# Altium footprint library ICL_komponenty_v1.PcbLib: 160 footprints (part 8 of 10)
Each footprint in its own frame and in the unit in brackets; x right, y up, seen from the top. Pads: shape width x height; smd on the part's side, far side on the other; paste and mask are expansions set on the pad; w line width, h text height; cw(c..) or ccw(c..) is an arc to the next point about the centre after c.
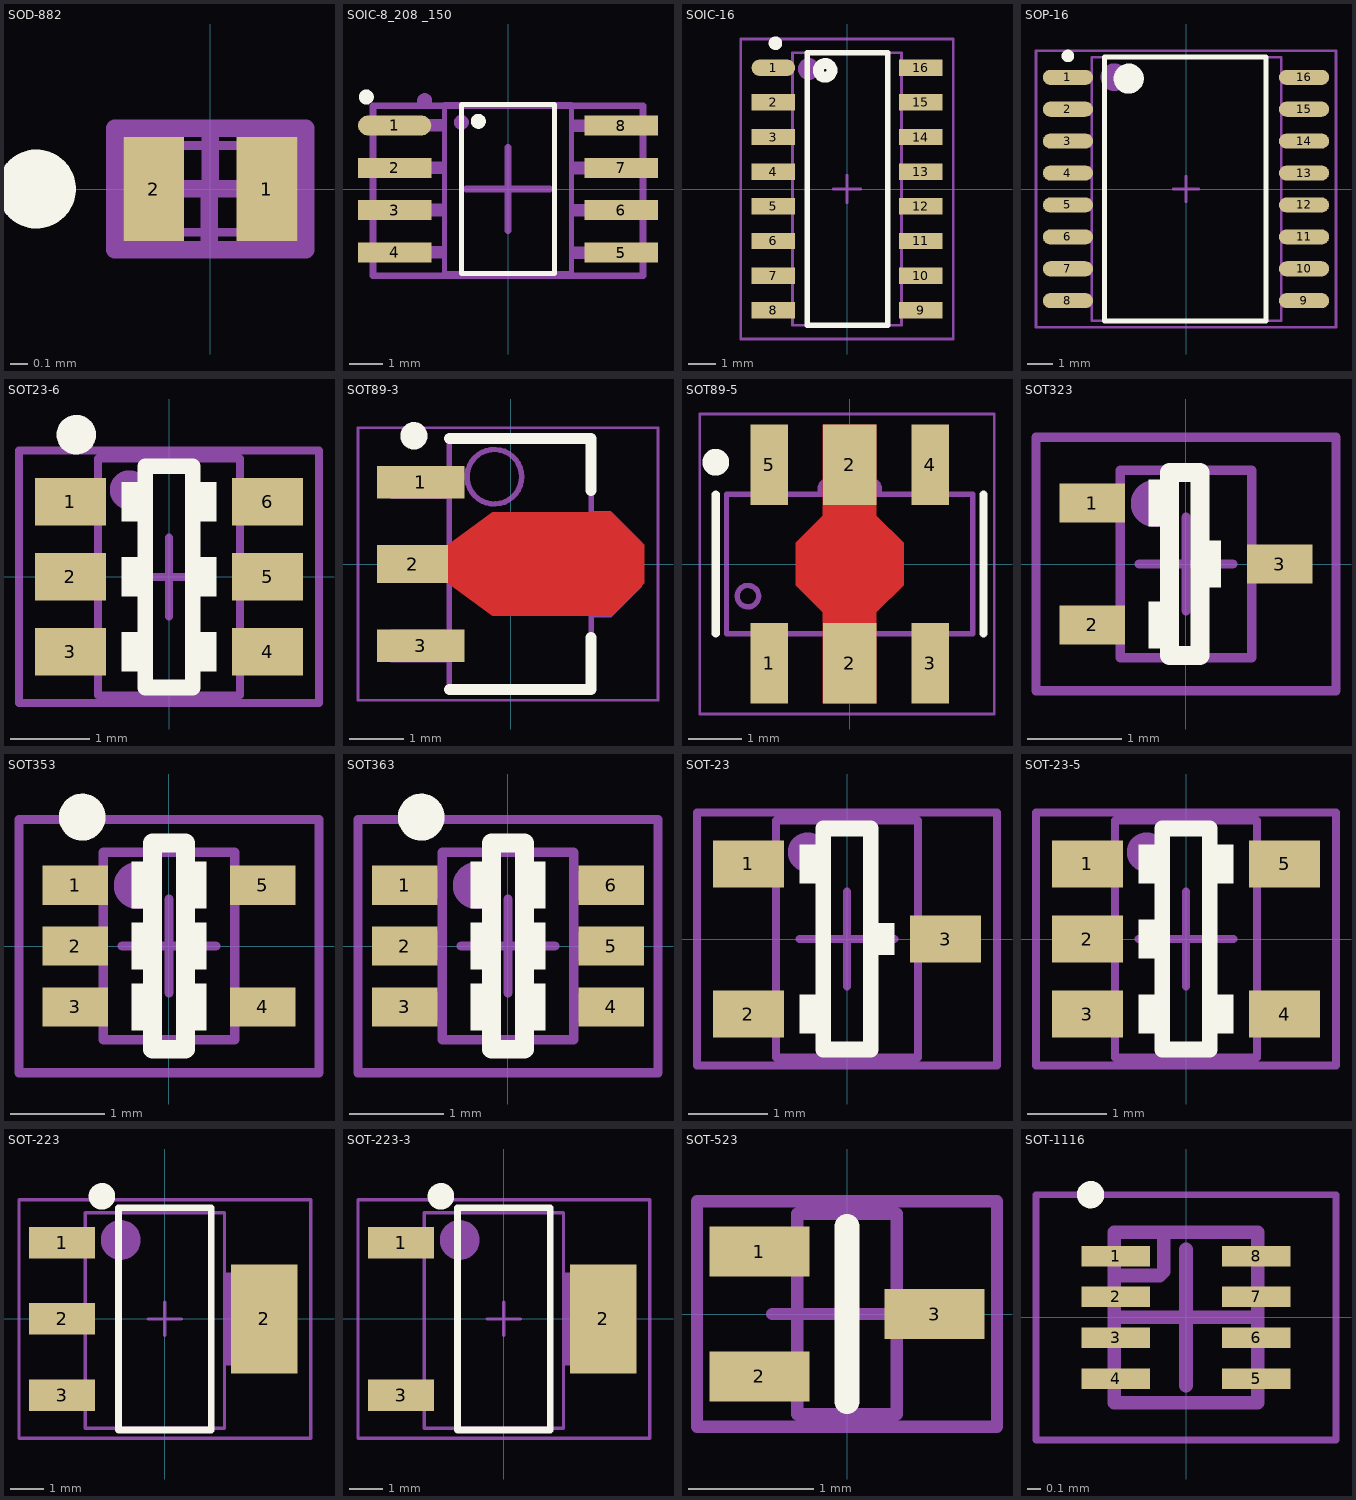
[diagram p7: the footprints below, top view; thin cyan lines are the x and y axes]

## SOD-882 [mm]
pads (2):
  rect 0.35x0.6 smd: 1(0.325,0) 2(-0.325,0)
Top Overlay:
  circle w0.254: c-1,0 r0.1
Top M11-12_SMOT:
  rectangle: -0.474,-0.25 -0.374,0.25
  rectangle: -0.3,-0.25 -0.2,0.25
  rectangle: 0.35,-0.25 0.45,0.25
  lines w0.05: -0.45,-0.249 0.427,-0.249 ; -0.45,0.25 0.425,0.25
Top M13-14_SDES:
  text "'.Designator'" at -2.316,0.633 h0.4
Top M15-16_SORG:
  lines w0.1: -0.304,0.001 -0.004,0.001 ; -0.005,-0.299 -0.005,0.001 0.295,0.001 ; 0,0 0,0.3 ; -0.55,-0.35 0.55,-0.35 0.55,0.35 -0.55,0.35 -0.55,-0.35
3D body: height 2, standoff 0, extent -0.5,-0.299 0.5,0.3

## SOIC-8_208 _150 [mm] "150 - 208mm soic 8 package FLASH"
pads (8):
  oval 2.2x0.6 smd: 1(-3.4,1.905)
  rect 2.2x0.6 smd: 2(-3.4,0.635) 3(-3.4,-0.635) 4(-3.4,-1.905) 5(3.4,-1.905) 6(3.4,-0.635) 7(3.4,0.635) 8(3.4,1.905)
Top Overlay:
  circle w0.25: c-4.252,2.76 r0.1
  circle w0.25: c-0.889,2.032 r0.1
  lines w0.152: -1.397,-2.54 1.397,-2.54 1.397,2.54 -1.397,2.54 -1.397,-2.54
Top M11-12_SMOT:
  circle w0.25: c-1.4,2 r0.1
  circle w0.25: c-2.5,2.65 r0.1
  region: 3.6,2.092 1.9,2.092 1.9,1.71 3.6,1.71
  region: 3.6,-1.718 1.9,-1.718 1.9,-2.1 3.6,-2.1
  rectangle: -3.6,1.718 -1.9,2.1
  rectangle: -3.6,-2.092 -1.9,-1.71
  region: 3.6,0.822 1.9,0.822 1.9,0.44 3.6,0.44
  region: 3.6,-0.448 1.9,-0.448 1.9,-0.83 3.6,-0.83
  rectangle: -3.6,0.448 -1.9,0.83
  rectangle: -3.6,-0.822 -1.9,-0.44
  lines w0.152: -0.64,2.54 0.576,2.54 1.9,2.54 1.9,-2.54 -1.9,-2.54 -1.9,2.54 -0.64,2.54 ; -0.64,2.54 -0.64,2.54
Top M13-14_SDES:
  text "'.Designator'" at -6.798,-0.5 h1.2
Top M15-16_SORG:
  lines w0.2: -1.25,0 0,0 ; 0,-1.25 0,0 ; 0,1.25 0,0 ; 1.25,0 0,0 ; -4.05,-2.6 4.05,-2.6 4.05,2.5 -4.05,2.5 -4.05,-2.6
3D body "SO-8.STEP": height 1.89, standoff -0.01, extent -3.144,-2.515 3.195,2.489

## SOIC-16 [mm] "SOIC, 16-Leads, Body 10,0x4,0mm (max), Pitch 1,27mm, IPC Low Density"
height 1.75
pads (16):
  oval 1.6x0.6 smd: 1(-2.7,4.445)
  rect 1.6x0.6 smd: 2(-2.7,3.175) 3(-2.7,1.905) 4(-2.7,0.635) 5(-2.7,-0.635) 6(-2.7,-1.905) 7(-2.7,-3.175) 8(-2.7,-4.445) 9(2.7,-4.445) 10(2.7,-3.175) 11(2.7,-1.905) 12(2.7,-0.635) 13(2.7,0.635) 14(2.7,1.905) 15(2.7,3.175) 16(2.7,4.445)
Top Overlay:
  circle w0.4: c-0.8,4.35 r0.25
  circle w0.25: c-2.625,5.345 r0.125
  lines w0.2: -1.45,-5 1.5,-5 1.5,5 -1.45,5 -1.45,-5
Top M11-12_SMOT:
  circle w0.4: c-1.4,4.4 r0.2
  rectangle: -2.85,-4.64 -2,-4.24
  rectangle: -2.85,-3.37 -2,-2.97
  rectangle: -2.85,-0.83 -2,-0.43
  rectangle: -2.85,0.44 -2,0.84
  rectangle: -2.85,2.98 -2,3.38
  rectangle: -2.85,4.25 -2,4.65
  region: 2.85,-4.25 2,-4.25 2,-4.65 2.85,-4.65
  region: 2.85,-2.98 2,-2.98 2,-3.38 2.85,-3.38
  region: 2.85,-0.44 2,-0.44 2,-0.84 2.85,-0.84
  region: 2.85,0.83 2,0.83 2,0.43 2.85,0.43
  region: 2.85,3.37 2,3.37 2,2.97 2.85,2.97
  region: 2.85,4.64 2,4.64 2,4.24 2.85,4.24
  rectangle: -2.85,-2.1 -2,-1.7
  rectangle: -2.85,1.71 -2,2.11
  region: 2.85,-1.71 2,-1.71 2,-2.11 2.85,-2.11
  region: 2.85,2.1 2,2.1 2,1.7 2.85,1.7
  lines w0.1: -2,-5 -2,5 2,5 2,-5 -2,-5
Top M13-14_SDES:
  text "'.Designator'" at 0.5,-6.798 h1.2
Top M15-16_SORG:
  lines w0.1: -0.5,0 0.5,0 ; 0,-0.5 0,0.5 ; -3.9,-5.5 3.9,-5.5 3.9,5.5 -3.9,5.5 -3.9,-5.5
3D body "SO-16.step": height 1.45, standoff 0, extent -2.857,-4.991 3.048,4.991

## SOP-16 [mm]
height 2
pads (16):
  oval 2x0.6 smd: 1(-4.7,4.445) 2(-4.7,3.175) 3(-4.7,1.905) 4(-4.7,0.635) 5(-4.7,-0.635) 6(-4.7,-1.905) 7(-4.7,-3.175) 8(-4.7,-4.445) 9(4.7,-4.445) 10(4.7,-3.175) 11(4.7,-1.905) 12(4.7,-0.635) 13(4.7,0.635) 14(4.7,1.905) 15(4.7,3.175) 16(4.7,4.445)
Top Overlay:
  circle w0.25: c-4.7,5.295 r0.125
  circle w0.6: c-2.281,4.394 r0.3
  lines w0.2: -3.251,-5.25 -3.251,5.25 3.175,5.25 3.175,-5.25 -3.251,-5.25
Top M11-12_SMOT:
  circle w0.6: c-2.85,4.45 r0.25
  rectangle: -5,-4.69 -3.75,-4.19
  rectangle: -5,-3.42 -3.75,-2.92
  rectangle: -5,-0.88 -3.75,-0.38
  rectangle: -5,0.39 -3.75,0.89
  rectangle: -5,2.93 -3.75,3.43
  rectangle: -5,4.2 -3.75,4.7
  region: 5,-4.2 3.75,-4.2 3.75,-4.7 5,-4.7
  region: 5,-2.93 3.75,-2.93 3.75,-3.43 5,-3.43
  region: 5,-0.39 3.75,-0.39 3.75,-0.89 5,-0.89
  region: 5,0.88 3.75,0.88 3.75,0.38 5,0.38
  region: 5,3.42 3.75,3.42 3.75,2.92 5,2.92
  region: 5,4.69 3.75,4.69 3.75,4.19 5,4.19
  rectangle: -5,-2.15 -3.75,-1.65
  rectangle: -5,1.66 -3.75,2.16
  region: 5,-1.66 3.75,-1.66 3.75,-2.16 5,-2.16
  region: 5,2.15 3.75,2.15 3.75,1.65 5,1.65
  lines w0.1: -3.75,-5.25 -3.75,5.25 3.8,5.25 3.8,-5.25 -3.75,-5.25
Top M13-14_SDES:
  text "'.Designator'" at 0.5,-6.798 h1.2
Top M15-16_SORG:
  lines w0.1: -0.5,0 0.5,0 ; 0,-0.5 0,0.5 ; -5.969,-5.5 -5.969,5.5 5.969,5.5 5.969,-5.5 -5.969,-5.5
3D body "so16w.step": height 3.5, standoff 0, extent -5.15,-5.171 5.15,5.029

## SOT23-6 [mm] "Zetex"
height 1.45
pads (6):
  rect 0.9x0.6 smd: 1(-1.25,0.95) 2(-1.25,0) 3(-1.25,-0.95) 4(1.25,-0.95) 5(1.25,0) 6(1.25,0.95)
Top Overlay:
  circle w0.25: c-1.175,1.8 r0.125
  region: 0.6,1.2 0.2,1.2 0.2,0.7 0.6,0.7
  region: 0.6,0.25 0.2,0.25 0.2,-0.25 0.6,-0.25
  region: 0.6,-0.7 0.2,-0.7 0.2,-1.2 0.6,-1.2
  rectangle: -0.6,-1.2 -0.2,-0.7
  rectangle: -0.6,-0.25 -0.2,0.25
  rectangle: -0.6,0.7 -0.2,1.2
  lines w0.2: -0.3,-1.4 0.3,-1.4 0.3,1.4 -0.3,1.4 -0.3,-1.4
Top M11-12_SMOT:
  circle w0.3: c-0.5,1.1 r0.1
  rectangle: -1.5,-1.2 -0.9,-0.7
  rectangle: -1.5,0.7 -0.9,1.2
  region: 1.5,-0.7 0.9,-0.7 0.9,-1.2 1.5,-1.2
  region: 1.5,1.2 0.9,1.2 0.9,0.7 1.5,0.7
  rectangle: -1.5,-0.25 -0.9,0.25
  region: 1.5,0.25 0.9,0.25 0.9,-0.25 1.5,-0.25
  lines w0.1: -0.9,-1.5 -0.9,1.5 0.9,1.5 0.9,-1.5 -0.9,-1.5
Top M13-14_SDES:
  text "'.Designator'" at 0.292,-4.265 h0.7
Top M15-16_SORG:
  lines w0.1: -0.5,0 0.5,0 ; 0,-0.5 0,0.5 ; -1.9,-1.6 -1.9,1.6 1.9,1.6 1.9,-1.6 -1.9,-1.6
3D body "SOT23-6.STEP": height 1.3, standoff 0, extent -1.448,-1.499 1.552,1.501

## SOT89-3 [mm] "SOT89-3"
height 1.6
pads (3):
  rect 1.6x0.6 smd: 1(-1.65,1.5) 3(-1.65,-1.5)
  rect 1.3x0.7 smd: 2(-1.8,0)
Top Layer:
  region: -1.2,0.313 -0.335,0.95 1.85,0.95 2.45,0.35 2.45,-0.35 1.85,-0.95 -0.335,-0.95 -1.2,-0.313
Top Overlay:
  circle w0.25: c-1.775,2.35 r0.125
  lines w0.2: -1.125,-2.3 1.475,-2.3 1.475,-1.35 ; -1.125,2.3 1.475,2.3 1.475,1.35
Top M11-12_SMOT:
  circle w0.1: c-0.3,1.6 r0.5
  rectangle: -2.2,1.194 -1.125,1.8
  rectangle: -2.2,-0.319 -1.125,0.3
  rectangle: -2.2,-1.806 -1.125,-1.2
  region: 1.475,0.969 1.831,0.969 2.4,0.4 2.4,-0.42 1.841,-0.979 1.492,-0.979 1.475,-0.962
  lines w0.1: -1.125,-2.3 -1.125,2.3 1.475,2.3 1.475,-2.3 -1.125,-2.3
Top M13-14_SDES:
  text "'.Designator'" at 0.417,-5.965 h1
Top M15-16_SORG:
  lines w0.05: -2.8,-2.5 -2.8,2.5 2.7,2.5 2.7,-2.5 -2.8,-2.5
  lines w0.1: -0.325,0 0.675,0 ; 0.175,-0.5 0.175,0.5
3D body "SOT89-3.step": height 1.6, standoff 0, extent -2.2,-2.297 2,2.296

## SOT89-5 [mm] "SOT89-5"
height 1.6
pads (6):
  rect 0.7x1.5 smd: 1(-1.5,-1.85) 3(1.5,-1.85) 4(1.5,1.85) 5(-1.5,1.85)
  rect 1x1.5 smd: 2(0,-1.85) 2(0,1.85)
Top Layer:
  region: -1.008,0.392 -0.5,0.9 -0.5,2.6 0.5,2.6 0.5,0.9 1.008,0.392 1.008,-0.4 0.5,-0.9 0.5,-2.6 -0.5,-2.6 -0.5,-0.9 -1.008,-0.4
Top Overlay:
  circle w0.25: c-2.5,1.9 r0.125
  lines w0.15: -2.5,-1.3 -2.5,1.3 ; 2.5,-1.3 2.5,1.3
Top M11-12_SMOT:
  circle w0.1: c-1.9,-0.6 r0.2
  region: -1.2,-2.3 -1.2,-1.325 -1.806,-1.325 -1.806,-2.3
  region: 1.8,-2.3 1.8,-1.325 1.194,-1.325 1.194,-2.3
  region: 0.3,-2.3 0.3,-1.325 -0.306,-1.325 -0.306,-2.3
  region: 1.2,2.3 1.2,1.325 1.806,1.325 1.806,2.3
  region: -1.8,2.3 -1.8,1.325 -1.194,1.325 -1.194,2.3
  region: -0.6,1.3 -0.6,1.4 -0.6,1.44 -0.57,1.513 -0.513,1.57 -0.44,1.6 -0.4,1.6 -0.38,1.602 -0.344,1.617 -0.317,1.644 -0.302,1.68 -0.3,1.7 -0.3,2.3 0.3,2.3 0.3,1.7 0.302,1.68 0.317,1.644 0.344,1.617 0.38,1.602 0.4,1.6 0.44,1.6 0.513,1.57 0.57,1.513 0.6,1.44 0.6,1.4 0.6,1.3
  lines w0.1: -2.3,-1.3 2.3,-1.3 2.3,1.3 -2.3,1.3 -2.3,-1.3
Top M13-14_SDES:
  text "'.Designator'" at -5.665,-0.417 h1
Top M15-16_SORG:
  lines w0.05: -2.8,-2.8 2.7,-2.8 2.7,2.8 -2.8,2.8 -2.8,-2.8
  lines w0.1: -0.525,0 0.475,0 ; -0.025,-0.5 -0.025,0.5
3D body "SOT-89-5.step": height 1.51, standoff 0.01, extent -2.25,-2.175 2.25,2.175

## SOT323 [mm]
height 1.1
pads (3):
  rect 0.7x0.42 smd: 1(-1,0.65) 2(-1,-0.65) 3(1,0)
Top Overlay:
  rectangle: 0.2,-0.25 0.375,0.25
  rectangle: -0.4,0.4 -0.15,0.9
  rectangle: -0.4,-0.9 -0.15,-0.4
  lines w0.2: -0.175,-0.975 -0.175,0.975 0.15,0.975 0.15,-0.975 -0.175,-0.975
Top M11-12_SMOT:
  circle w0.3: c-0.339,0.645 r0.1
  rectangle: -1.138,-0.8 -0.7,-0.489
  rectangle: -1.138,0.5 -0.7,0.811
  region: 1.138,0.15 0.7,0.15 0.7,-0.161 1.138,-0.161
  lines w0.1: -0.7,-1 -0.7,1 0.7,1 0.7,-1 -0.7,-1
Top M13-14_SDES:
  text "'.Designator'" at 0.25,-3.599 h0.6
Top M15-16_SORG:
  lines w0.1: -0.5,0 0.5,0 ; 0,-0.5 0,0.5 ; -1.6,-1.35 1.6,-1.35 1.6,1.35 -1.6,1.35 -1.6,-1.35
3D body "SOT323_SC70-3_.STEP": height 1.11, standoff 0.01, extent -1.122,-1.1 1.123,1.1

## SOT353 [mm]
height 1.1
pads (5):
  rect 0.7x0.42 smd: 1(-1,0.65) 2(-1,0) 3(-1,-0.65) 4(1,-0.65) 5(1,0.65)
Top Overlay:
  circle w0.25: c-0.925,1.375 r0.125
  rectangle: -0.4,0.4 -0.15,0.9
  rectangle: -0.4,-0.25 -0.15,0.25
  rectangle: -0.4,-0.9 -0.15,-0.4
  region: 0.4,0.9 0.15,0.9 0.15,0.4 0.4,0.4
  region: 0.4,0.25 0.15,0.25 0.15,-0.25 0.4,-0.25
  region: 0.4,-0.4 0.15,-0.4 0.15,-0.9 0.4,-0.9
  lines w0.2: -0.175,-1.1 0.175,-1.1 0.175,1.1 -0.175,1.1 -0.175,-1.1
Top M11-12_SMOT:
  circle w0.3: c-0.339,0.645 r0.1
  rectangle: -1.138,-0.8 -0.7,-0.489
  rectangle: -1.138,0.5 -0.7,0.811
  region: 1.138,-0.5 0.7,-0.5 0.7,-0.811 1.138,-0.811
  region: 1.138,0.8 0.7,0.8 0.7,0.489 1.138,0.489
  rectangle: -1.138,-0.15 -0.7,0.161
  lines w0.1: -0.7,-1 -0.7,1 0.7,1 0.7,-1 -0.7,-1
Top M13-14_SDES:
  text "'.Designator'" at 0.25,-3.699 h0.6
Top M15-16_SORG:
  lines w0.1: -0.5,0 0.5,0 ; 0,-0.5 0,0.5 ; -1.6,-1.35 -1.6,1.35 1.6,1.35 1.6,-1.35 -1.6,-1.35
3D body "SC70-5-1.step": height 0.95, standoff 0, extent -1.05,-1 1.05,1

## SOT363 [mm]
height 1.1
pads (6):
  rect 0.7x0.42 smd: 1(-1.1,0.65) 2(-1.1,0) 3(-1.1,-0.65) 4(1.1,-0.65) 5(1.1,0) 6(1.1,0.65)
Top Overlay:
  circle w0.25: c-0.925,1.375 r0.125
  rectangle: -0.4,0.4 -0.15,0.9
  rectangle: -0.4,-0.25 -0.15,0.25
  rectangle: -0.4,-0.9 -0.15,-0.4
  region: 0.4,0.9 0.15,0.9 0.15,0.4 0.4,0.4
  region: 0.4,0.25 0.15,0.25 0.15,-0.25 0.4,-0.25
  region: 0.4,-0.4 0.15,-0.4 0.15,-0.9 0.4,-0.9
  lines w0.2: -0.175,-1.1 0.175,-1.1 0.175,1.1 -0.175,1.1 -0.175,-1.1
Top M11-12_SMOT:
  circle w0.3: c-0.339,0.645 r0.1
  rectangle: -1.138,-0.8 -0.7,-0.489
  rectangle: -1.138,0.5 -0.7,0.811
  region: 1.138,-0.5 0.7,-0.5 0.7,-0.811 1.138,-0.811
  region: 1.138,0.8 0.7,0.8 0.7,0.489 1.138,0.489
  rectangle: -1.138,-0.15 -0.7,0.161
  region: 1.138,0.15 0.7,0.15 0.7,-0.161 1.138,-0.161
  lines w0.1: -0.7,-1 -0.7,1 0.7,1 0.7,-1 -0.7,-1
Top M13-14_SDES:
  text "'.Designator'" at 0.25,-3.699 h0.6
Top M15-16_SORG:
  lines w0.1: -0.5,0 0.5,0 ; 0,-0.5 0,0.5 ; -1.6,-1.35 -1.6,1.35 1.6,1.35 1.6,-1.35 -1.6,-1.35
3D body "SOT363.step": height 1, standoff 0.01, extent -1.05,-1 1.05,1

## SOT-23 [mm]
pads (3):
  rect 0.9x0.6 smd: 1(-1.25,0.95) 2(-1.25,-0.95) 3(1.25,0)
Top Overlay:
  rectangle: -0.6,-1.2 -0.2,-0.7
  rectangle: -0.6,0.7 -0.2,1.2
  region: 0.6,0.2 0.2,0.2 0.2,-0.2 0.6,-0.2
  lines w0.2: -0.3,-1.4 -0.3,1.4 0.3,1.4 0.3,-1.4 -0.3,-1.4
Top M11-12_SMOT:
  circle w0.3: c-0.5,1.1 r0.1
  rectangle: -1.5,-1.2 -0.9,-0.7
  rectangle: -1.5,0.7 -0.9,1.2
  region: 1.5,0.25 0.9,0.25 0.9,-0.25 1.5,-0.25
  lines w0.1: -0.9,-1.5 -0.9,1.5 0.9,1.5 0.9,-1.5 -0.9,-1.5
Top M13-14_SDES:
  text "'.Designator'" at 0.292,-4.315 h0.7
Top M15-16_SORG:
  lines w0.1: -0.6,0 0,0 ; 0,-0.6 0,0 ; 0,0.6 0,0 ; 0.6,0 0,0 ; -1.9,-1.6 -1.9,1.6 1.9,1.6 1.9,-1.6 -1.9,-1.6
3D body "SOT-23-3.STEP": height 1.02, standoff 0.01, extent -1.27,-1.5 1.23,1.5

## SOT-23-5 [mm]
pads (5):
  rect 0.9x0.6 smd: 1(-1.25,0.95) 2(-1.25,0) 3(-1.25,-0.95) 4(1.25,-0.95) 5(1.25,0.95)
Top Overlay:
  region: 0.6,-0.7 0.2,-0.7 0.2,-1.2 0.6,-1.2
  region: 0.6,1.2 0.2,1.2 0.2,0.7 0.6,0.7
  rectangle: -0.6,-0.25 -0.2,0.25
  rectangle: -0.6,0.7 -0.2,1.2
  rectangle: -0.6,-1.2 -0.2,-0.7
  lines w0.2: -0.3,-1.4 0.3,-1.4 0.3,1.4 -0.3,1.4 -0.3,-1.4
Top M11-12_SMOT:
  circle w0.3: c-0.5,1.1 r0.1
  region: 1.5,1.2 0.9,1.2 0.9,0.7 1.5,0.7
  region: 1.5,-0.7 0.9,-0.7 0.9,-1.2 1.5,-1.2
  rectangle: -1.5,-0.25 -0.9,0.25
  rectangle: -1.5,0.7 -0.9,1.2
  rectangle: -1.5,-1.2 -0.9,-0.7
  lines w0.1: -0.9,-1.5 0.9,-1.5 0.9,1.5 -0.9,1.5 -0.9,-1.5
Top M13-14_SDES:
  text "'.Designator'" at 0.292,-3.965 h0.7
Top M15-16_SORG:
  lines w0.1: -0.6,0 0,0 ; 0,-0.6 0,0 ; 0,0.6 0,0 ; 0.6,0 0,0 ; -1.9,-1.6 1.9,-1.6 1.9,1.6 -1.9,1.6 -1.9,-1.6
3D body "SOT23-5-1.STEP": height 1.31, standoff 0.01, extent -1.5,-1.5 1.5,1.5

## SOT-223 [mm]
height 1.8
pads (4):
  rect 2x0.95 smd: 1(-3.1,2.3) 2(-3.1,0) 3(-3.1,-2.3)
  rect 2x3.3 smd: 2(3,0)
Top Overlay:
  circle w0.4: c-1.9,3.7 r0.2
  lines w0.2: -1.4,-3.35 -1.4,3.35 1.4,3.35 1.4,-3.35 -1.4,-3.35
Top M11-12_SMOT:
  circle w0.6: c-1.332,2.382 r0.3
  rectangle: 1.8,-1.4 3.4,1.4
  rectangle: -3.6,-0.389 -2.414,0.4
  rectangle: -3.6,1.911 -2.414,2.7
  rectangle: -3.6,-2.689 -2.414,-1.9
  lines w0.1: -2.4,-3.3 1.8,-3.3 1.8,3.2 -2.4,3.2 -2.4,-3.3
Top M13-14_SDES:
  text "'.Designator'" at 0.467,-6.165 h1
Top M15-16_SORG:
  lines w0.1: -0.5,0 0.5,0 ; 0,-0.5 0,0.5 ; -4.4,-3.6 -4.4,3.6 4.4,3.6 4.4,-3.6 -4.4,-3.6
3D body "SOT-223-2.step": height 1.7, standoff 0.02, extent -3.582,-3.276 3.378,3.223

## SOT-223-3 [mm]
height 1.8
pads (3):
  rect 2x0.95 smd: 1(-3.1,2.3) 3(-3.1,-2.3)
  rect 2x3.3 smd: 2(3,0)
Top Overlay:
  circle w0.4: c-1.9,3.7 r0.2
  lines w0.2: -1.4,-3.35 -1.4,3.35 1.4,3.35 1.4,-3.35 -1.4,-3.35
Top M11-12_SMOT:
  circle w0.6: c-1.332,2.382 r0.3
  rectangle: 1.8,-1.4 3.4,1.4
  rectangle: -3.6,1.911 -2.414,2.7
  rectangle: -3.6,-2.689 -2.414,-1.9
  lines w0.1: -2.4,-3.3 1.8,-3.3 1.8,3.2 -2.4,3.2 -2.4,-3.3
Top M13-14_SDES:
  text "'.Designator'" at 0.467,-6.165 h1
Top M15-16_SORG:
  lines w0.1: -0.5,0 0.5,0 ; 0,-0.5 0,0.5 ; -4.4,-3.6 -4.4,3.6 4.4,3.6 4.4,-3.6 -4.4,-3.6
3D body "SOT-223-2.step": height 1.7, standoff 0.02, extent -3.582,-3.276 3.378,3.223

## SOT-523 [mm]
pads (3):
  rect 0.8x0.4 smd: 1(-0.7,0.5) 2(-0.7,-0.5) 3(0.7,0)
Top Overlay:
  lines w0.2: 0,-0.7 0,0.7
Top M11-12_SMOT:
  rectangle: -0.8,0.4 -0.4,0.6
  rectangle: -0.8,-0.6 -0.4,-0.4
  region: 0.8,0.1 0.4,0.1 0.4,-0.099 0.8,-0.099
  lines w0.1: -0.4,-0.8 -0.4,0.8 0.4,0.8 0.4,-0.8 -0.4,-0.8
Top M13-14_SDES:
  text "'.Designator'" at 0.292,-4.265 h0.7
Top M15-16_SORG:
  lines w0.1: -0.6,0 0,0 ; 0,-0.6 0,0 ; 0,0.6 0,0 ; 0.6,0 0,0 ; -1.2,-0.9 -1.2,0.9 1.2,0.9 1.2,-0.9 -1.2,-0.9
3D body "SOT-523.step": height 0.8, standoff 0, extent -0.8,-0.8 0.8,0.8

## SOT-1116 [mm] "NXP SOT 1116"
height 0.35
pads (8):
  rect 0.5x0.15 smd: 1(-0.515,0.45) 2(-0.515,0.15) 3(-0.515,-0.15) 4(-0.515,-0.45) 5(0.515,-0.45) 6(0.515,-0.15) 7(0.515,0.15) 8(0.515,0.45)
Top Overlay:
  circle w0.1: c-0.7,0.9 r0.05
Top M11-12_SMOT:
  rectangle: 0.3,0.398 0.525,0.5
  rectangle: 0.3,0.098 0.525,0.2
  rectangle: 0.3,-0.202 0.525,-0.1
  rectangle: 0.3,-0.502 0.525,-0.4
  region: -0.3,0.502 -0.525,0.502 -0.525,0.4 -0.3,0.4
  region: -0.3,0.202 -0.525,0.202 -0.525,0.1 -0.3,0.1
  region: -0.3,-0.098 -0.525,-0.098 -0.525,-0.2 -0.3,-0.2
  region: -0.3,-0.398 -0.525,-0.398 -0.525,-0.5 -0.3,-0.5
  lines w0.1: -0.525,0.308 -0.192,0.308 -0.163,0.337 -0.163,0.625 ; -0.525,-0.625 -0.525,0.625 0.525,0.625 0.525,-0.625 -0.525,-0.625
Top M13-14_SDES:
  text "'.Designator'" at -4.365,1.608 h0.7
Top M15-16_SORG:
  lines w0.05: -1.1,-0.9 -1.1,0.9 1.1,0.9 1.1,-0.9 -1.1,-0.9
  lines w0.1: -0.5,0 0.5,0 ; 0,-0.5 0,0.5
3D body "SOT-1116.step": height 0.35, standoff 0, extent -0.565,-0.625 0.565,0.625